# Altium integrated library ISSI SRAM QUAD(P).IntLib: 1732 symbols (part 1 of 1459)
Pins are listed as number, name and electrical type; pins without a type are passive.

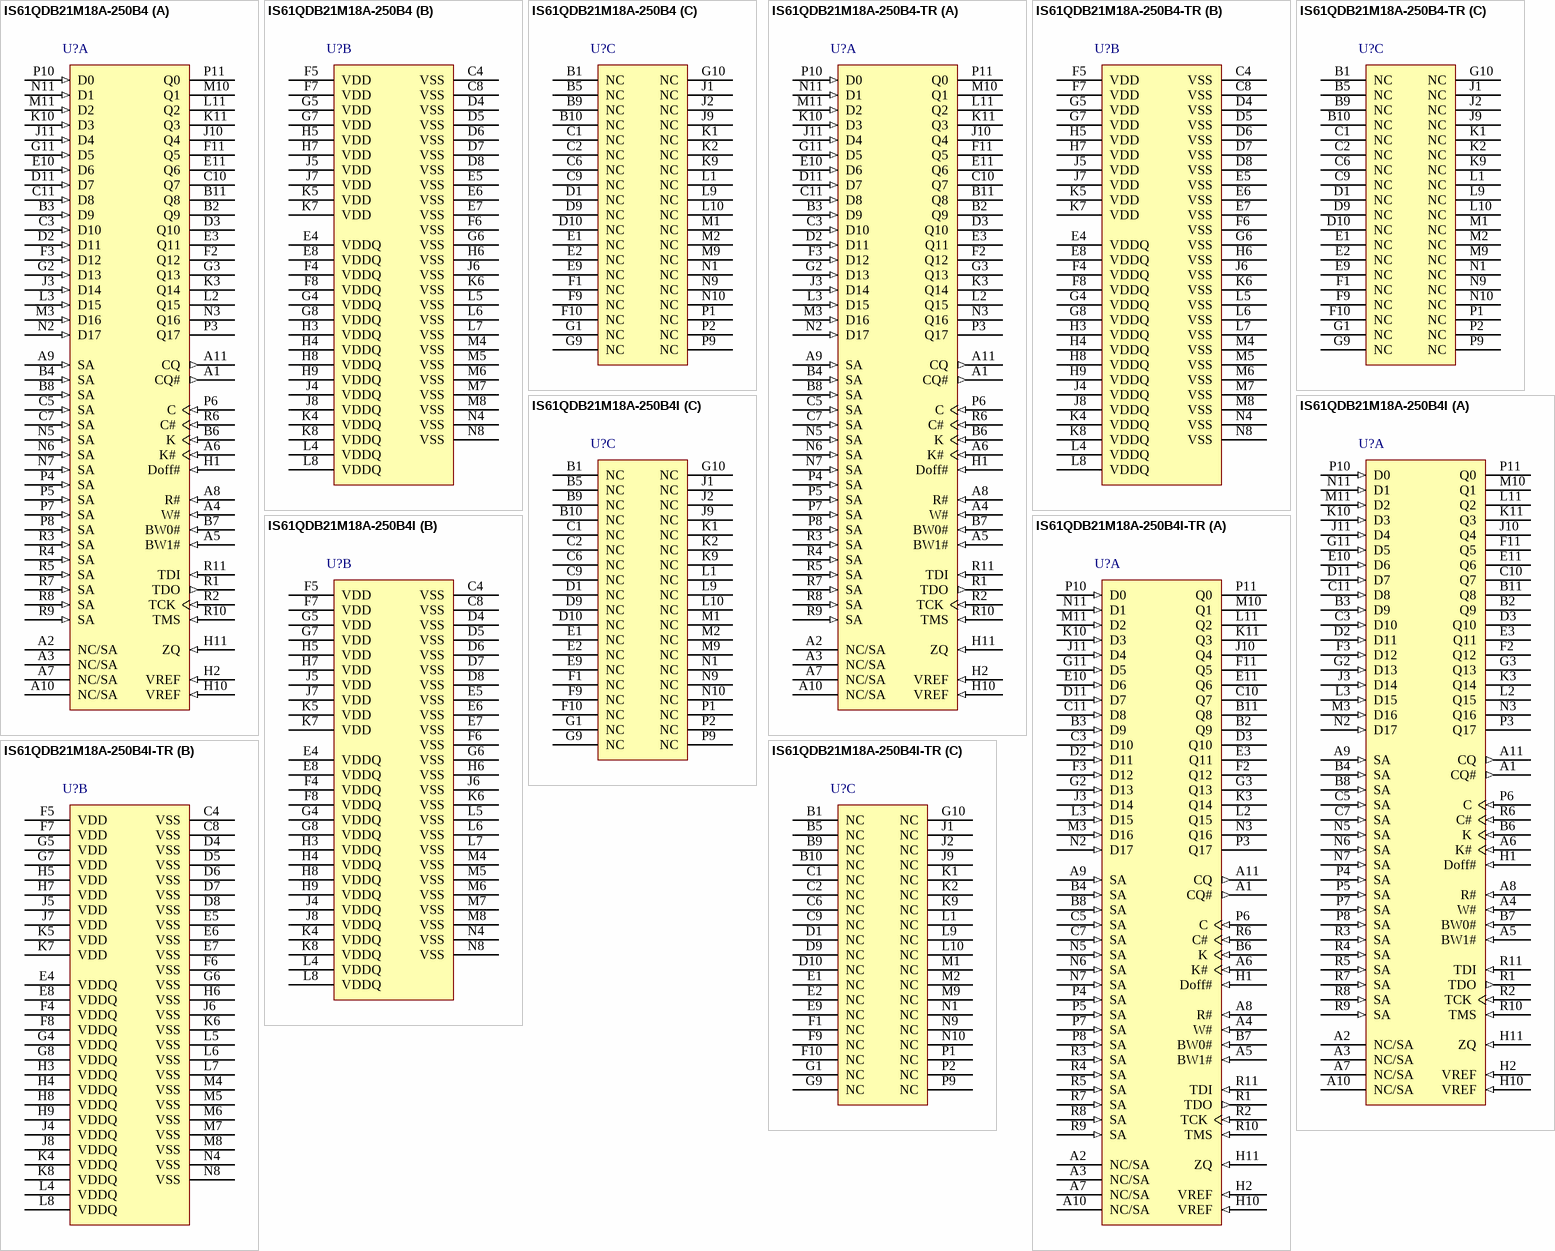
[diagram p0: symbols IS61QDB21M18A-250B4 to IS61QDB21M18A-250B4I-TR]

## IS61QDB21M18A-250B4
designator U?
18 M QUAD (Burst 2) Synchronous SRAM, 1 M x 18, 0 to 70 degC, 165-Pin BGA (LF-BGA-165); Manufacturer: Integrated Silicon Solution Inc (ISSI); PartNumber: IS61QDB21M18A-250B4; Burst: 2; Density: 18M; Organization: 1Mx18; Packing: Tube / Tray; DatasheetVersion: Rev. A; PackageVersion: Rev. A, 11/2011; PackageReference: LF-BGA-165; PackageDescription: 165-Pin 13 x 15 mm LF-BGA, Pitch 1 mm; Mounting Technology: Surface Mount; ComponentLink1Description: Manufacturer URL; ComponentLink1URL: http://www.issi.com/US/index.shtml; ComponentLink2Description: Datasheet; ComponentLink2URL: http://www.issi.com/WW/pdf/61QDB21M18A-51236A.pdf; ComponentLink3Description: Package Specification; ComponentLink3URL: http://www.issi.com/WW/pdf/61QDP2B21M18A-51236A.pdf
footprint ISSI-LF-BGA-165-13000X15000DX1400DEA (BGA, 165-Balls, Body 15x13 mm, Pitch 1 mm)
part A pins: A1 CQ# (out) "Synchronous echo clock outputs: The edges of these outputs are tightly matched to the synchronous data outputs and can be used as a data valid indication. These signals run freely and do not stop when Q tri-states", A2 NC/SA, A3 NC/SA, A4 W# (in) "Synchronous write: When low, this input causes the address inputs to be registered and a WRITE cycle to be initiated. This input must meet setup and hold times around the rising edge of K.", A5 BW1# (in) "Synchronous byte writes: When low, these inputs cause their respective byte to be registered and written during WRITE cycles. These signals are sampled on the same edge as the corresponding data and must meet setup and hold (See Datasheet)", A6 K# (in) "Input clock: This input clock pair registers address and control inputs on the rising edge of K, and registers data on the rising edge of K and the rising edge of K#. K# is ideally 180 degrees out of phase with K. All (See Datasheet)", A7 NC/SA "Synchronous byte writes: When low, these inputs cause their respective byte to be registered and written during WRITE cycles. These signals are sampled on the same edge as the corresponding data and must meet setup and hold (See Datasheet)", A8 R# (in) "Synchronous read: When low, this input causes the address inputs to be registered and a READ cycle to be initiated. This input must meet setup and hold times around the rising edge of K.", A9 SA (in) "Synchronous address inputs: These inputs are registered and must meet the setup and hold times around the rising edge of K.", A10 NC/SA, A11 CQ (out) "Synchronous echo clock outputs: The edges of these outputs are tightly matched to the synchronous data outputs and can be used as a data valid indication. These signals run freely and do not stop when Q tri-states.", B2 Q9 (hiz) "Synchronous data outputs: Output data is synchronized to the respective C and C#, or to the respective K and K# if C and /C are tied to high. This bus operates in response to R# commands. See BALL CONFIGURATION figures for (See Datasheet)", B3 D9 (in) "Synchronous data inputs: Input data must meet setup and hold times around the rising edges of K and K# during WRITE operations. See BALL CONFIGURATION figures for ball site location of individual signals. The x18 device uses (See Datasheet)", B4 SA (in) "Synchronous address inputs: These inputs are registered and must meet the setup and hold times around the rising edge of K.", B6 K (in) "Input clock: This input clock pair registers address and control inputs on the rising edge of K, and registers data on the rising edge of K and the rising edge of K#. K# is ideally 180 degrees out of phase with K. All (See Datasheet)", B7 BW0# (in) "Synchronous byte writes: When low, these inputs cause their respective byte to be registered and written during WRITE cycles. These signals are sampled on the same edge as the corresponding data and must meet setup and hold (See Datasheet)", B8 SA (in) "Synchronous address inputs: These inputs are registered and must meet the setup and hold times around the rising edge of K.", B11 Q8 (hiz) "Synchronous data outputs: Output data is synchronized to the respective C and C#, or to the respective K and K# if C and /C are tied to high. This bus operates in response to R# commands. See BALL CONFIGURATION figures for (See Datasheet)", C3 D10 (in) "Synchronous data inputs: Input data must meet setup and hold times around the rising edges of K and K# during WRITE operations. See BALL CONFIGURATION figures for ball site location of individual signals. The x18 device uses (See Datasheet)", C5 SA (in) "Synchronous address inputs: These inputs are registered and must meet the setup and hold times around the rising edge of K.", C7 SA (in) "Synchronous address inputs: These inputs are registered and must meet the setup and hold times around the rising edge of K.", C10 Q7 (hiz) "Synchronous data outputs: Output data is synchronized to the respective C and C#, or to the respective K and K# if C and /C are tied to high. This bus operates in response to R# commands. See BALL CONFIGURATION figures for (See Datasheet)", C11 D8 (in) "Synchronous data inputs: Input data must meet setup and hold times around the rising edges of K and K# during WRITE operations. See BALL CONFIGURATION figures for ball site location of individual signals. The x18 device uses (See Datasheet)", D2 D11 (in) "Synchronous data inputs: Input data must meet setup and hold times around the rising edges of K and K# during WRITE operations. See BALL CONFIGURATION figures for ball site location of individual signals. The x18 device uses (See Datasheet)", D3 Q10 (hiz) "Synchronous data outputs: Output data is synchronized to the respective C and C#, or to the respective K and K# if C and /C are tied to high. This bus operates in response to R# commands. See BALL CONFIGURATION figures for (See Datasheet)", D11 D7 (in) "Synchronous data inputs: Input data must meet setup and hold times around the rising edges of K and K# during WRITE operations. See BALL CONFIGURATION figures for ball site location of individual signals. The x18 device uses (See Datasheet)", E3 Q11 (hiz) "Synchronous data outputs: Output data is synchronized to the respective C and C#, or to the respective K and K# if C and /C are tied to high. This bus operates in response to R# commands. See BALL CONFIGURATION figures for (See Datasheet)", E10 D6 (in) "Synchronous data inputs: Input data must meet setup and hold times around the rising edges of K and K# during WRITE operations. See BALL CONFIGURATION figures for ball site location of individual signals. The x18 device uses (See Datasheet)", E11 Q6 (hiz) "Synchronous data outputs: Output data is synchronized to the respective C and C#, or to the respective K and K# if C and /C are tied to high. This bus operates in response to R# commands. See BALL CONFIGURATION figures for (See Datasheet)", F2 Q12 (hiz) "Synchronous data outputs: Output data is synchronized to the respective C and C#, or to the respective K and K# if C and /C are tied to high. This bus operates in response to R# commands. See BALL CONFIGURATION figures for (See Datasheet)", F3 D12 (in) "Synchronous data inputs: Input data must meet setup and hold times around the rising edges of K and K# during WRITE operations. See BALL CONFIGURATION figures for ball site location of individual signals. The x18 device uses (See Datasheet)", F11 Q5 (hiz) "Synchronous data outputs: Output data is synchronized to the respective C and C#, or to the respective K and K# if C and /C are tied to high. This bus operates in response to R# commands. See BALL CONFIGURATION figures for (See Datasheet)", G2 D13 (in) "Synchronous data inputs: Input data must meet setup and hold times around the rising edges of K and K# during WRITE operations. See BALL CONFIGURATION figures for ball site location of individual signals. The x18 device uses (See Datasheet)", G3 Q13 (hiz) "Synchronous data outputs: Output data is synchronized to the respective C and C#, or to the respective K and K# if C and /C are tied to high. This bus operates in response to R# commands. See BALL CONFIGURATION figures for (See Datasheet)", G11 D5 (in) "Synchronous data inputs: Input data must meet setup and hold times around the rising edges of K and K# during WRITE operations. See BALL CONFIGURATION figures for ball site location of individual signals. The x18 device uses (See Datasheet)", H1 Doff# (in) "DLL disable and reset input : when low, this input causes the DLL to be bypassed and reset the previous DLL information. When high, DLL will start operating and lock the frequency after tCK lock time. The device behaves in 1.(See Datasheet)", H2 VREF (in) "HSTL input reference voltage: Nominally VDDQ/2, but may be adjusted to improve system noise margin. Provides a reference voltage for the HSTL input buffers.", H10 VREF (in) "HSTL input reference voltage: Nominally VDDQ/2, but may be adjusted to improve system noise margin. Provides a reference voltage for the HSTL input buffers.", H11 ZQ (in) "Output impedance matching input: This input is used to tune the device outputs to the system data bus impedance. Q and CQ output impedance are set to 0.2xRQ, where RQ is a resistor from this ball to ground. This ball can be (See Datasheet)", J3 D14 (in) "Synchronous data inputs: Input data must meet setup and hold times around the rising edges of K and K# during WRITE operations. See BALL CONFIGURATION figures for ball site location of individual signals. The x18 device uses (See Datasheet)", J10 Q4 (hiz) "Synchronous data outputs: Output data is synchronized to the respective C and C#, or to the respective K and K# if C and /C are tied to high. This bus operates in response to R# commands. See BALL CONFIGURATION figures for (See Datasheet)", J11 D4 (in) "Synchronous data inputs: Input data must meet setup and hold times around the rising edges of K and K# during WRITE operations. See BALL CONFIGURATION figures for ball site location of individual signals. The x18 device uses (See Datasheet)", K3 Q14 (hiz) "Synchronous data outputs: Output data is synchronized to the respective C and C#, or to the respective K and K# if C and /C are tied to high. This bus operates in response to R# commands. See BALL CONFIGURATION figures for (See Datasheet)", K10 D3 (in) "Synchronous data inputs: Input data must meet setup and hold times around the rising edges of K and K# during WRITE operations. See BALL CONFIGURATION figures for ball site location of individual signals. The x18 device uses (See Datasheet)", K11 Q3 (hiz) "Synchronous data outputs: Output data is synchronized to the respective C and C#, or to the respective K and K# if C and /C are tied to high. This bus operates in response to R# commands. See BALL CONFIGURATION figures for (See Datasheet)", L2 Q15 (hiz) "Synchronous data outputs: Output data is synchronized to the respective C and C#, or to the respective K and K# if C and /C are tied to high. This bus operates in response to R# commands. See BALL CONFIGURATION figures for (See Datasheet)", L3 D15 (in) "Synchronous data inputs: Input data must meet setup and hold times around the rising edges of K and K# during WRITE operations. See BALL CONFIGURATION figures for ball site location of individual signals. The x18 device uses (See Datasheet)", L11 Q2 (hiz) "Synchronous data outputs: Output data is synchronized to the respective C and C#, or to the respective K and K# if C and /C are tied to high. This bus operates in response to R# commands. See BALL CONFIGURATION figures for (See Datasheet)", M3 D16 (in) "Synchronous data inputs: Input data must meet setup and hold times around the rising edges of K and K# during WRITE operations. See BALL CONFIGURATION figures for ball site location of individual signals. The x18 device uses (See Datasheet)", M10 Q1 (hiz) "Synchronous data outputs: Output data is synchronized to the respective C and C#, or to the respective K and K# if C and /C are tied to high. This bus operates in response to R# commands. See BALL CONFIGURATION figures for (See Datasheet)", M11 D2 (in) "Synchronous data inputs: Input data must meet setup and hold times around the rising edges of K and K# during WRITE operations. See BALL CONFIGURATION figures for ball site location of individual signals. The x18 device uses (See Datasheet)", N2 D17 (in) "Synchronous data inputs: Input data must meet setup and hold times around the rising edges of K and K# during WRITE operations. See BALL CONFIGURATION figures for ball site location of individual signals. The x18 device uses (See Datasheet)", N3 Q16 (hiz) "Synchronous data outputs: Output data is synchronized to the respective C and C#, or to the respective K and K# if C and /C are tied to high. This bus operates in response to R# commands. See BALL CONFIGURATION figures for (See Datasheet)", N5 SA (in) "Synchronous address inputs: These inputs are registered and must meet the setup and hold times around the rising edge of K.", N6 SA (in) "Synchronous address inputs: These inputs are registered and must meet the setup and hold times around the rising edge of K.", N7 SA (in) "Synchronous address inputs: These inputs are registered and must meet the setup and hold times around the rising edge of K.", N11 D1 (in) "Synchronous data inputs: Input data must meet setup and hold times around the rising edges of K and K# during WRITE operations. See BALL CONFIGURATION figures for ball site location of individual signals. The x18 device uses (See Datasheet)", P3 Q17 (hiz) "Synchronous data outputs: Output data is synchronized to the respective C and C#, or to the respective K and K# if C and /C are tied to high. This bus operates in response to R# commands. See BALL CONFIGURATION figures for (See Datasheet)", P4 SA (in) "Synchronous address inputs: These inputs are registered and must meet the setup and hold times around the rising edge of K.", P5 SA (in) "Synchronous address inputs: These inputs are registered and must meet the setup and hold times around the rising edge of K.", P6 C (in) "Input clock for output data. C and C# are used to clock out the READ data. They can be used together to deskew the flight times of various devices on the board back to the controller. See application example for further (See Datasheet)", P7 SA (in) "Synchronous address inputs: These inputs are registered and must meet the setup and hold times around the rising edge of K.", P8 SA (in) "Synchronous address inputs: These inputs are registered and must meet the setup and hold times around the rising edge of K.", P10 D0 (in) "Synchronous data inputs: Input data must meet setup and hold times around the rising edges of K and K# during WRITE operations. See BALL CONFIGURATION figures for ball site location of individual signals. The x18 device uses (See Datasheet)", P11 Q0 (hiz) "Synchronous data outputs: Output data is synchronized to the respective C and C#, or to the respective K and K# if C and /C are tied to high. This bus operates in response to R# commands. See BALL CONFIGURATION figures for (See Datasheet)", R1 TDO (out) "IEEE1149.1 output pin for JTAG.", R2 TCK (in) "IEEE1149.1 input pin for JTAG.", R3 SA (in) "Synchronous address inputs: These inputs are registered and must meet the setup and hold times around the rising edge of K.", R4 SA (in) "Synchronous address inputs: These inputs are registered and must meet the setup and hold times around the rising edge of K.", R5 SA (in) "Synchronous address inputs: These inputs are registered and must meet the setup and hold times around the rising edge of K.", R6 C# (in) "Input clock for output data. C and C# are used to clock out the READ data. They can be used together to deskew the flight times of various devices on the board back to the controller. See application example for further (See Datasheet)", R7 SA (in) "Synchronous address inputs: These inputs are registered and must meet the setup and hold times around the rising edge of K.", R8 SA (in) "Synchronous address inputs: These inputs are registered and must meet the setup and hold times around the rising edge of K.", R9 SA (in) "Synchronous address inputs: These inputs are registered and must meet the setup and hold times around the rising edge of K.", R10 TMS (in) "IEEE1149.1 input pin for JTAG.", R11 TDI (in) "IEEE1149.1 input pins for JTAG."
part B pins: C4 VSS (power) "Ground of the device", C8 VSS (power) "Ground of the device", D4 VSS (power) "Ground of the device", D5 VSS (power) "Ground of the device", D6 VSS (power) "Ground of the device", D7 VSS (power) "Ground of the device", D8 VSS (power) "Ground of the device", E4 VDDQ (power) "Power supply: Isolated output buffer supply. Nominally 1.5 V. See DC Characteristics and Operating Conditions for range.", E5 VSS (power) "Ground of the device", E6 VSS (power) "Ground of the device", E7 VSS (power) "Ground of the device", E8 VDDQ (power) "Power supply: Isolated output buffer supply. Nominally 1.5 V. See DC Characteristics and Operating Conditions for range.", F4 VDDQ (power) "Power supply: Isolated output buffer supply. Nominally 1.5 V. See DC Characteristics and Operating Conditions for range.", F5 VDD (power) "Power supply: 1.8 V nominal. See DC Characteristics and Operating Conditions for range.", F6 VSS (power) "Ground of the device", F7 VDD (power) "Power supply: 1.8 V nominal. See DC Characteristics and Operating Conditions for range.", F8 VDDQ (power) "Power supply: Isolated output buffer supply. Nominally 1.5 V. See DC Characteristics and Operating Conditions for range.", G4 VDDQ (power) "Power supply: Isolated output buffer supply. Nominally 1.5 V. See DC Characteristics and Operating Conditions for range.", G5 VDD (power) "Power supply: 1.8 V nominal. See DC Characteristics and Operating Conditions for range.", G6 VSS (power) "Ground of the device", G7 VDD (power) "Power supply: 1.8 V nominal. See DC Characteristics and Operating Conditions for range.", G8 VDDQ (power) "Power supply: Isolated output buffer supply. Nominally 1.5 V. See DC Characteristics and Operating Conditions for range.", H3 VDDQ (power) "Power supply: Isolated output buffer supply. Nominally 1.5 V. See DC Characteristics and Operating Conditions for range.", H4 VDDQ (power) "Power supply: Isolated output buffer supply. Nominally 1.5 V. See DC Characteristics and Operating Conditions for range.", H5 VDD (power) "Power supply: 1.8 V nominal. See DC Characteristics and Operating Conditions for range.", H6 VSS (power) "Ground of the device", H7 VDD (power) "Power supply: 1.8 V nominal. See DC Characteristics and Operating Conditions for range.", H8 VDDQ (power) "Power supply: Isolated output buffer supply. Nominally 1.5 V. See DC Characteristics and Operating Conditions for range.", H9 VDDQ (power) "Power supply: Isolated output buffer supply. Nominally 1.5 V. See DC Characteristics and Operating Conditions for range.", J4 VDDQ (power) "Power supply: Isolated output buffer supply. Nominally 1.5 V. See DC Characteristics and Operating Conditions for range.", J5 VDD (power) "Power supply: 1.8 V nominal. See DC Characteristics and Operating Conditions for range.", J6 VSS (power) "Ground of the device", J7 VDD (power) "Power supply: 1.8 V nominal. See DC Characteristics and Operating Conditions for range.", J8 VDDQ (power) "Power supply: Isolated output buffer supply. Nominally 1.5 V. See DC Characteristics and Operating Conditions for range.", K4 VDDQ (power) "Power supply: Isolated output buffer supply. Nominally 1.5 V. See DC Characteristics and Operating Conditions for range.", K5 VDD (power) "Power supply: 1.8 V nominal. See DC Characteristics and Operating Conditions for range.", K6 VSS (power) "Ground of the device", K7 VDD (power) "Power supply: 1.8 V nominal. See DC Characteristics and Operating Conditions for range.", K8 VDDQ (power) "Power supply: Isolated output buffer supply. Nominally 1.5 V. See DC Characteristics and Operating Conditions for range.", L4 VDDQ (power) "Power supply: Isolated output buffer supply. Nominally 1.5 V. See DC Characteristics and Operating Conditions for range.", L5 VSS (power) "Ground of the device", L6 VSS (power) "Ground of the device", L7 VSS (power) "Ground of the device", L8 VDDQ (power) "Power supply: Isolated output buffer supply. Nominally 1.5 V. See DC Characteristics and Operating Conditions for range.", M4 VSS (power) "Ground of the device", M5 VSS (power) "Ground of the device", M6 VSS (power) "Ground of the device", M7 VSS (power) "Ground of the device", M8 VSS (power) "Ground of the device", N4 VSS (power) "Ground of the device", N8 VSS (power) "Ground of the device"
part C pins: B1 NC "No connect: These signals should be left floating or connected to ground to improve package heat dissipation.", B5 NC "No connect: These signals should be left floating or connected to ground to improve package heat dissipation.", B9 NC "No connect: These signals should be left floating or connected to ground to improve package heat dissipation.", B10 NC "No connect: These signals should be left floating or connected to ground to improve package heat dissipation.", C1 NC "No connect: These signals should be left floating or connected to ground to improve package heat dissipation.", C2 NC "No connect: These signals should be left floating or connected to ground to improve package heat dissipation.", C6 NC "No connect: These signals should be left floating or connected to ground to improve package heat dissipation.", C9 NC "No connect: These signals should be left floating or connected to ground to improve package heat dissipation.", D1 NC "No connect: These signals should be left floating or connected to ground to improve package heat dissipation.", D9 NC "No connect: These signals should be left floating or connected to ground to improve package heat dissipation.", D10 NC "No connect: These signals should be left floating or connected to ground to improve package heat dissipation.", E1 NC "No connect: These signals should be left floating or connected to ground to improve package heat dissipation.", E2 NC "No connect: These signals should be left floating or connected to ground to improve package heat dissipation.", E9 NC "No connect: These signals should be left floating or connected to ground to improve package heat dissipation.", F1 NC "No connect: These signals should be left floating or connected to ground to improve package heat dissipation.", F9 NC "No connect: These signals should be left floating or connected to ground to improve package heat dissipation.", F10 NC "No connect: These signals should be left floating or connected to ground to improve package heat dissipation.", G1 NC "No connect: These signals should be left floating or connected to ground to improve package heat dissipation.", G9 NC "No connect: These signals should be left floating or connected to ground to improve package heat dissipation.", G10 NC "No connect: These signals should be left floating or connected to ground to improve package heat dissipation.", J1 NC "No connect: These signals should be left floating or connected to ground to improve package heat dissipation.", J2 NC "No connect: These signals should be left floating or connected to ground to improve package heat dissipation.", J9 NC "No connect: These signals should be left floating or connected to ground to improve package heat dissipation.", K1 NC "No connect: These signals should be left floating or connected to ground to improve package heat dissipation.", K2 NC "No connect: These signals should be left floating or connected to ground to improve package heat dissipation.", K9 NC "No connect: These signals should be left floating or connected to ground to improve package heat dissipation.", L1 NC "No connect: These signals should be left floating or connected to ground to improve package heat dissipation.", L9 NC "No connect: These signals should be left floating or connected to ground to improve package heat dissipation.", L10 NC "No connect: These signals should be left floating or connected to ground to improve package heat dissipation.", M1 NC "No connect: These signals should be left floating or connected to ground to improve package heat dissipation.", M2 NC "No connect: These signals should be left floating or connected to ground to improve package heat dissipation.", M9 NC "No connect: These signals should be left floating or connected to ground to improve package heat dissipation.", N1 NC "No connect: These signals should be left floating or connected to ground to improve package heat dissipation.", N9 NC "No connect: These signals should be left floating or connected to ground to improve package heat dissipation.", N10 NC "No connect: These signals should be left floating or connected to ground to improve package heat dissipation.", P1 NC "No connect: These signals should be left floating or connected to ground to improve package heat dissipation.", P2 NC "No connect: These signals should be left floating or connected to ground to improve package heat dissipation.", P9 NC "No connect: These signals should be left floating or connected to ground to improve package heat dissipation."

## IS61QDB21M18A-250B4-TR
designator U?
18 M QUAD (Burst 2) Synchronous SRAM, 1 M x 18, 0 to 70 degC, 165-Pin BGA (LF-BGA-165); Manufacturer: Integrated Silicon Solution Inc (ISSI); PartNumber: IS61QDB21M18A-250B4-TR; Burst: 2; Density: 18M; Organization: 1Mx18; Packing: Tape & Reel; DatasheetVersion: Rev. A; PackageVersion: Rev. A, 11/2011; PackageReference: LF-BGA-165; PackageDescription: 165-Pin 13 x 15 mm LF-BGA, Pitch 1 mm; Mounting Technology: Surface Mount; ComponentLink1Description: Manufacturer URL; ComponentLink1URL: http://www.issi.com/US/index.shtml; ComponentLink2Description: Datasheet; ComponentLink2URL: http://www.issi.com/WW/pdf/61QDB21M18A-51236A.pdf; ComponentLink3Description: Package Specification; ComponentLink3URL: http://www.issi.com/WW/pdf/61QDP2B21M18A-51236A.pdf
footprint ISSI-LF-BGA-165-13000X15000DX1400DEA (BGA, 165-Balls, Body 15x13 mm, Pitch 1 mm)
part A pins: A1 CQ# (out) "Synchronous echo clock outputs: The edges of these outputs are tightly matched to the synchronous data outputs and can be used as a data valid indication. These signals run freely and do not stop when Q tri-states", A2 NC/SA, A3 NC/SA, A4 W# (in) "Synchronous write: When low, this input causes the address inputs to be registered and a WRITE cycle to be initiated. This input must meet setup and hold times around the rising edge of K.", A5 BW1# (in) "Synchronous byte writes: When low, these inputs cause their respective byte to be registered and written during WRITE cycles. These signals are sampled on the same edge as the corresponding data and must meet setup and hold (See Datasheet)", A6 K# (in) "Input clock: This input clock pair registers address and control inputs on the rising edge of K, and registers data on the rising edge of K and the rising edge of K#. K# is ideally 180 degrees out of phase with K. All (See Datasheet)", A7 NC/SA "Synchronous byte writes: When low, these inputs cause their respective byte to be registered and written during WRITE cycles. These signals are sampled on the same edge as the corresponding data and must meet setup and hold (See Datasheet)", A8 R# (in) "Synchronous read: When low, this input causes the address inputs to be registered and a READ cycle to be initiated. This input must meet setup and hold times around the rising edge of K.", A9 SA (in) "Synchronous address inputs: These inputs are registered and must meet the setup and hold times around the rising edge of K.", A10 NC/SA, A11 CQ (out) "Synchronous echo clock outputs: The edges of these outputs are tightly matched to the synchronous data outputs and can be used as a data valid indication. These signals run freely and do not stop when Q tri-states.", B2 Q9 (hiz) "Synchronous data outputs: Output data is synchronized to the respective C and C#, or to the respective K and K# if C and /C are tied to high. This bus operates in response to R# commands. See BALL CONFIGURATION figures for (See Datasheet)", B3 D9 (in) "Synchronous data inputs: Input data must meet setup and hold times around the rising edges of K and K# during WRITE operations. See BALL CONFIGURATION figures for ball site location of individual signals. The x18 device uses (See Datasheet)", B4 SA (in) "Synchronous address inputs: These inputs are registered and must meet the setup and hold times around the rising edge of K.", B6 K (in) "Input clock: This input clock pair registers address and control inputs on the rising edge of K, and registers data on the rising edge of K and the rising edge of K#. K# is ideally 180 degrees out of phase with K. All (See Datasheet)", B7 BW0# (in) "Synchronous byte writes: When low, these inputs cause their respective byte to be registered and written during WRITE cycles. These signals are sampled on the same edge as the corresponding data and must meet setup and hold (See Datasheet)", B8 SA (in) "Synchronous address inputs: These inputs are registered and must meet the setup and hold times around the rising edge of K.", B11 Q8 (hiz) "Synchronous data outputs: Output data is synchronized to the respective C and C#, or to the respective K and K# if C and /C are tied to high. This bus operates in response to R# commands. See BALL CONFIGURATION figures for (See Datasheet)", C3 D10 (in) "Synchronous data inputs: Input data must meet setup and hold times around the rising edges of K and K# during WRITE operations. See BALL CONFIGURATION figures for ball site location of individual signals. The x18 device uses (See Datasheet)", C5 SA (in) "Synchronous address inputs: These inputs are registered and must meet the setup and hold times around the rising edge of K.", C7 SA (in) "Synchronous address inputs: These inputs are registered and must meet the setup and hold times around the rising edge of K.", C10 Q7 (hiz) "Synchronous data outputs: Output data is synchronized to the respective C and C#, or to the respective K and K# if C and /C are tied to high. This bus operates in response to R# commands. See BALL CONFIGURATION figures for (See Datasheet)", C11 D8 (in) "Synchronous data inputs: Input data must meet setup and hold times around the rising edges of K and K# during WRITE operations. See BALL CONFIGURATION figures for ball site location of individual signals. The x18 device uses (See Datasheet)", D2 D11 (in) "Synchronous data inputs: Input data must meet setup and hold times around the rising edges of K and K# during WRITE operations. See BALL CONFIGURATION figures for ball site location of individual signals. The x18 device uses (See Datasheet)", D3 Q10 (hiz) "Synchronous data outputs: Output data is synchronized to the respective C and C#, or to the respective K and K# if C and /C are tied to high. This bus operates in response to R# commands. See BALL CONFIGURATION figures for (See Datasheet)", D11 D7 (in) "Synchronous data inputs: Input data must meet setup and hold times around the rising edges of K and K# during WRITE operations. See BALL CONFIGURATION figures for ball site location of individual signals. The x18 device uses (See Datasheet)", E3 Q11 (hiz) "Synchronous data outputs: Output data is synchronized to the respective C and C#, or to the respective K and K# if C and /C are tied to high. This bus operates in response to R# commands. See BALL CONFIGURATION figures for (See Datasheet)", E10 D6 (in) "Synchronous data inputs: Input data must meet setup and hold times around the rising edges of K and K# during WRITE operations. See BALL CONFIGURATION figures for ball site location of individual signals. The x18 device uses (See Datasheet)", E11 Q6 (hiz) "Synchronous data outputs: Output data is synchronized to the respective C and C#, or to the respective K and K# if C and /C are tied to high. This bus operates in response to R# commands. See BALL CONFIGURATION figures for (See Datasheet)", F2 Q12 (hiz) "Synchronous data outputs: Output data is synchronized to the respective C and C#, or to the respective K and K# if C and /C are tied to high. This bus operates in response to R# commands. See BALL CONFIGURATION figures for (See Datasheet)", F3 D12 (in) "Synchronous data inputs: Input data must meet setup and hold times around the rising edges of K and K# during WRITE operations. See BALL CONFIGURATION figures for ball site location of individual signals. The x18 device uses (See Datasheet)", F11 Q5 (hiz) "Synchronous data outputs: Output data is synchronized to the respective C and C#, or to the respective K and K# if C and /C are tied to high. This bus operates in response to R# commands. See BALL CONFIGURATION figures for (See Datasheet)", G2 D13 (in) "Synchronous data inputs: Input data must meet setup and hold times around the rising edges of K and K# during WRITE operations. See BALL CONFIGURATION figures for ball site location of individual signals. The x18 device uses (See Datasheet)", G3 Q13 (hiz) "Synchronous data outputs: Output data is synchronized to the respective C and C#, or to the respective K and K# if C and /C are tied to high. This bus operates in response to R# commands. See BALL CONFIGURATION figures for (See Datasheet)", G11 D5 (in) "Synchronous data inputs: Input data must meet setup and hold times around the rising edges of K and K# during WRITE operations. See BALL CONFIGURATION figures for ball site location of individual signals. The x18 device uses (See Datasheet)", H1 Doff# (in) "DLL disable and reset input : when low, this input causes the DLL to be bypassed and reset the previous DLL information. When high, DLL will start operating and lock the frequency after tCK lock time. The device behaves in 1.(See Datasheet)", H2 VREF (in) "HSTL input reference voltage: Nominally VDDQ/2, but may be adjusted to improve system noise margin. Provides a reference voltage for the HSTL input buffers.", H10 VREF (in) "HSTL input reference voltage: Nominally VDDQ/2, but may be adjusted to improve system noise margin. Provides a reference voltage for the HSTL input buffers.", H11 ZQ (in) "Output impedance matching input: This input is used to tune the device outputs to the system data bus impedance. Q and CQ output impedance are set to 0.2xRQ, where RQ is a resistor from this ball to ground. This ball can be (See Datasheet)", J3 D14 (in) "Synchronous data inputs: Input data must meet setup and hold times around the rising edges of K and K# during WRITE operations. See BALL CONFIGURATION figures for ball site location of individual signals. The x18 device uses (See Datasheet)", J10 Q4 (hiz) "Synchronous data outputs: Output data is synchronized to the respective C and C#, or to the respective K and K# if C and /C are tied to high. This bus operates in response to R# commands. See BALL CONFIGURATION figures for (See Datasheet)", J11 D4 (in) "Synchronous data inputs: Input data must meet setup and hold times around the rising edges of K and K# during WRITE operations. See BALL CONFIGURATION figures for ball site location of individual signals. The x18 device uses (See Datasheet)", K3 Q14 (hiz) "Synchronous data outputs: Output data is synchronized to the respective C and C#, or to the respective K and K# if C and /C are tied to high. This bus operates in response to R# commands. See BALL CONFIGURATION figures for (See Datasheet)", K10 D3 (in) "Synchronous data inputs: Input data must meet setup and hold times around the rising edges of K and K# during WRITE operations. See BALL CONFIGURATION figures for ball site location of individual signals. The x18 device uses (See Datasheet)", K11 Q3 (hiz) "Synchronous data outputs: Output data is synchronized to the respective C and C#, or to the respective K and K# if C and /C are tied to high. This bus operates in response to R# commands. See BALL CONFIGURATION figures for (See Datasheet)", L2 Q15 (hiz) "Synchronous data outputs: Output data is synchronized to the respective C and C#, or to the respective K and K# if C and /C are tied to high. This bus operates in response to R# commands. See BALL CONFIGURATION figures for (See Datasheet)", L3 D15 (in) "Synchronous data inputs: Input data must meet setup and hold times around the rising edges of K and K# during WRITE operations. See BALL CONFIGURATION figures for ball site location of individual signals. The x18 device uses (See Datasheet)", L11 Q2 (hiz) "Synchronous data outputs: Output data is synchronized to the respective C and C#, or to the respective K and K# if C and /C are tied to high. This bus operates in response to R# commands. See BALL CONFIGURATION figures for (See Datasheet)", M3 D16 (in) "Synchronous data inputs: Input data must meet setup and hold times around the rising edges of K and K# during WRITE operations. See BALL CONFIGURATION figures for ball site location of individual signals. The x18 device uses (See Datasheet)", M10 Q1 (hiz) "Synchronous data outputs: Output data is synchronized to the respective C and C#, or to the respective K and K# if C and /C are tied to high. This bus operates in response to R# commands. See BALL CONFIGURATION figures for (See Datasheet)", M11 D2 (in) "Synchronous data inputs: Input data must meet setup and hold times around the rising edges of K and K# during WRITE operations. See BALL CONFIGURATION figures for ball site location of individual signals. The x18 device uses (See Datasheet)", N2 D17 (in) "Synchronous data inputs: Input data must meet setup and hold times around the rising edges of K and K# during WRITE operations. See BALL CONFIGURATION figures for ball site location of individual signals. The x18 device uses (See Datasheet)", N3 Q16 (hiz) "Synchronous data outputs: Output data is synchronized to the respective C and C#, or to the respective K and K# if C and /C are tied to high. This bus operates in response to R# commands. See BALL CONFIGURATION figures for (See Datasheet)", N5 SA (in) "Synchronous address inputs: These inputs are registered and must meet the setup and hold times around the rising edge of K.", N6 SA (in) "Synchronous address inputs: These inputs are registered and must meet the setup and hold times around the rising edge of K.", N7 SA (in) "Synchronous address inputs: These inputs are registered and must meet the setup and hold times around the rising edge of K.", N11 D1 (in) "Synchronous data inputs: Input data must meet setup and hold times around the rising edges of K and K# during WRITE operations. See BALL CONFIGURATION figures for ball site location of individual signals. The x18 device uses (See Datasheet)", P3 Q17 (hiz) "Synchronous data outputs: Output data is synchronized to the respective C and C#, or to the respective K and K# if C and /C are tied to high. This bus operates in response to R# commands. See BALL CONFIGURATION figures for (See Datasheet)", P4 SA (in) "Synchronous address inputs: These inputs are registered and must meet the setup and hold times around the rising edge of K.", P5 SA (in) "Synchronous address inputs: These inputs are registered and must meet the setup and hold times around the rising edge of K.", P6 C (in) "Input clock for output data. C and C# are used to clock out the READ data. They can be used together to deskew the flight times of various devices on the board back to the controller. See application example for further (See Datasheet)", P7 SA (in) "Synchronous address inputs: These inputs are registered and must meet the setup and hold times around the rising edge of K.", P8 SA (in) "Synchronous address inputs: These inputs are registered and must meet the setup and hold times around the rising edge of K.", P10 D0 (in) "Synchronous data inputs: Input data must meet setup and hold times around the rising edges of K and K# during WRITE operations. See BALL CONFIGURATION figures for ball site location of individual signals. The x18 device uses (See Datasheet)", P11 Q0 (hiz) "Synchronous data outputs: Output data is synchronized to the respective C and C#, or to the respective K and K# if C and /C are tied to high. This bus operates in response to R# commands. See BALL CONFIGURATION figures for (See Datasheet)", R1 TDO (out) "IEEE1149.1 output pin for JTAG.", R2 TCK (in) "IEEE1149.1 input pin for JTAG.", R3 SA (in) "Synchronous address inputs: These inputs are registered and must meet the setup and hold times around the rising edge of K.", R4 SA (in) "Synchronous address inputs: These inputs are registered and must meet the setup and hold times around the rising edge of K.", R5 SA (in) "Synchronous address inputs: These inputs are registered and must meet the setup and hold times around the rising edge of K.", R6 C# (in) "Input clock for output data. C and C# are used to clock out the READ data. They can be used together to deskew the flight times of various devices on the board back to the controller. See application example for further (See Datasheet)", R7 SA (in) "Synchronous address inputs: These inputs are registered and must meet the setup and hold times around the rising edge of K.", R8 SA (in) "Synchronous address inputs: These inputs are registered and must meet the setup and hold times around the rising edge of K.", R9 SA (in) "Synchronous address inputs: These inputs are registered and must meet the setup and hold times around the rising edge of K.", R10 TMS (in) "IEEE1149.1 input pin for JTAG.", R11 TDI (in) "IEEE1149.1 input pins for JTAG."
part B pins: C4 VSS (power) "Ground of the device", C8 VSS (power) "Ground of the device", D4 VSS (power) "Ground of the device", D5 VSS (power) "Ground of the device", D6 VSS (power) "Ground of the device", D7 VSS (power) "Ground of the device", D8 VSS (power) "Ground of the device", E4 VDDQ (power) "Power supply: Isolated output buffer supply. Nominally 1.5 V. See DC Characteristics and Operating Conditions for range.", E5 VSS (power) "Ground of the device", E6 VSS (power) "Ground of the device", E7 VSS (power) "Ground of the device", E8 VDDQ (power) "Power supply: Isolated output buffer supply. Nominally 1.5 V. See DC Characteristics and Operating Conditions for range.", F4 VDDQ (power) "Power supply: Isolated output buffer supply. Nominally 1.5 V. See DC Characteristics and Operating Conditions for range.", F5 VDD (power) "Power supply: 1.8 V nominal. See DC Characteristics and Operating Conditions for range.", F6 VSS (power) "Ground of the device", F7 VDD (power) "Power supply: 1.8 V nominal. See DC Characteristics and Operating Conditions for range.", F8 VDDQ (power) "Power supply: Isolated output buffer supply. Nominally 1.5 V. See DC Characteristics and Operating Conditions for range.", G4 VDDQ (power) "Power supply: Isolated output buffer supply. Nominally 1.5 V. See DC Characteristics and Operating Conditions for range.", G5 VDD (power) "Power supply: 1.8 V nominal. See DC Characteristics and Operating Conditions for range.", G6 VSS (power) "Ground of the device", G7 VDD (power) "Power supply: 1.8 V nominal. See DC Characteristics and Operating Conditions for range.", G8 VDDQ (power) "Power supply: Isolated output buffer supply. Nominally 1.5 V. See DC Characteristics and Operating Conditions for range.", H3 VDDQ (power) "Power supply: Isolated output buffer supply. Nominally 1.5 V. See DC Characteristics and Operating Conditions for range.", H4 VDDQ (power) "Power supply: Isolated output buffer supply. Nominally 1.5 V. See DC Characteristics and Operating Conditions for range.", H5 VDD (power) "Power supply: 1.8 V nominal. See DC Characteristics and Operating Conditions for range.", H6 VSS (power) "Ground of the device", H7 VDD (power) "Power supply: 1.8 V nominal. See DC Characteristics and Operating Conditions for range.", H8 VDDQ (power) "Power supply: Isolated output buffer supply. Nominally 1.5 V. See DC Characteristics and Operating Conditions for range.", H9 VDDQ (power) "Power supply: Isolated output buffer supply. Nominally 1.5 V. See DC Characteristics and Operating Conditions for range.", J4 VDDQ (power) "Power supply: Isolated output buffer supply. Nominally 1.5 V. See DC Characteristics and Operating Conditions for range.", J5 VDD (power) "Power supply: 1.8 V nominal. See DC Characteristics and Operating Conditions for range.", J6 VSS (power) "Ground of the device", J7 VDD (power) "Power supply: 1.8 V nominal. See DC Characteristics and Operating Conditions for range.", J8 VDDQ (power) "Power supply: Isolated output buffer supply. Nominally 1.5 V. See DC Characteristics and Operating Conditions for range.", K4 VDDQ (power) "Power supply: Isolated output buffer supply. Nominally 1.5 V. See DC Characteristics and Operating Conditions for range.", K5 VDD (power) "Power supply: 1.8 V nominal. See DC Characteristics and Operating Conditions for range.", K6 VSS (power) "Ground of the device", K7 VDD (power) "Power supply: 1.8 V nominal. See DC Characteristics and Operating Conditions for range.", K8 VDDQ (power) "Power supply: Isolated output buffer supply. Nominally 1.5 V. See DC Characteristics and Operating Conditions for range.", L4 VDDQ (power) "Power supply: Isolated output buffer supply. Nominally 1.5 V. See DC Characteristics and Operating Conditions for range.", L5 VSS (power) "Ground of the device", L6 VSS (power) "Ground of the device", L7 VSS (power) "Ground of the device", L8 VDDQ (power) "Power supply: Isolated output buffer supply. Nominally 1.5 V. See DC Characteristics and Operating Conditions for range.", M4 VSS (power) "Ground of the device", M5 VSS (power) "Ground of the device", M6 VSS (power) "Ground of the device", M7 VSS (power) "Ground of the device", M8 VSS (power) "Ground of the device", N4 VSS (power) "Ground of the device", N8 VSS (power) "Ground of the device"
part C pins: B1 NC "No connect: These signals should be left floating or connected to ground to improve package heat dissipation.", B5 NC "No connect: These signals should be left floating or connected to ground to improve package heat dissipation.", B9 NC "No connect: These signals should be left floating or connected to ground to improve package heat dissipation.", B10 NC "No connect: These signals should be left floating or connected to ground to improve package heat dissipation.", C1 NC "No connect: These signals should be left floating or connected to ground to improve package heat dissipation.", C2 NC "No connect: These signals should be left floating or connected to ground to improve package heat dissipation.", C6 NC "No connect: These signals should be left floating or connected to ground to improve package heat dissipation.", C9 NC "No connect: These signals should be left floating or connected to ground to improve package heat dissipation.", D1 NC "No connect: These signals should be left floating or connected to ground to improve package heat dissipation.", D9 NC "No connect: These signals should be left floating or connected to ground to improve package heat dissipation.", D10 NC "No connect: These signals should be left floating or connected to ground to improve package heat dissipation.", E1 NC "No connect: These signals should be left floating or connected to ground to improve package heat dissipation.", E2 NC "No connect: These signals should be left floating or connected to ground to improve package heat dissipation.", E9 NC "No connect: These signals should be left floating or connected to ground to improve package heat dissipation.", F1 NC "No connect: These signals should be left floating or connected to ground to improve package heat dissipation.", F9 NC "No connect: These signals should be left floating or connected to ground to improve package heat dissipation.", F10 NC "No connect: These signals should be left floating or connected to ground to improve package heat dissipation.", G1 NC "No connect: These signals should be left floating or connected to ground to improve package heat dissipation.", G9 NC "No connect: These signals should be left floating or connected to ground to improve package heat dissipation.", G10 NC "No connect: These signals should be left floating or connected to ground to improve package heat dissipation.", J1 NC "No connect: These signals should be left floating or connected to ground to improve package heat dissipation.", J2 NC "No connect: These signals should be left floating or connected to ground to improve package heat dissipation.", J9 NC "No connect: These signals should be left floating or connected to ground to improve package heat dissipation.", K1 NC "No connect: These signals should be left floating or connected to ground to improve package heat dissipation.", K2 NC "No connect: These signals should be left floating or connected to ground to improve package heat dissipation.", K9 NC "No connect: These signals should be left floating or connected to ground to improve package heat dissipation.", L1 NC "No connect: These signals should be left floating or connected to ground to improve package heat dissipation.", L9 NC "No connect: These signals should be left floating or connected to ground to improve package heat dissipation.", L10 NC "No connect: These signals should be left floating or connected to ground to improve package heat dissipation.", M1 NC "No connect: These signals should be left floating or connected to ground to improve package heat dissipation.", M2 NC "No connect: These signals should be left floating or connected to ground to improve package heat dissipation.", M9 NC "No connect: These signals should be left floating or connected to ground to improve package heat dissipation.", N1 NC "No connect: These signals should be left floating or connected to ground to improve package heat dissipation.", N9 NC "No connect: These signals should be left floating or connected to ground to improve package heat dissipation.", N10 NC "No connect: These signals should be left floating or connected to ground to improve package heat dissipation.", P1 NC "No connect: These signals should be left floating or connected to ground to improve package heat dissipation.", P2 NC "No connect: These signals should be left floating or connected to ground to improve package heat dissipation.", P9 NC "No connect: These signals should be left floating or connected to ground to improve package heat dissipation."